# Altium footprint library Sensor.PcbLib: 51 footprints (part 4 of 4)
Each footprint in its own frame and in the unit in brackets; x right, y up, seen from the top. Pads: shape width x height; smd on the part's side, far side on the other; paste and mask are expansions set on the pad; w line width, h text height; cw(c..) or ccw(c..) is an arc to the next point about the centre after c.
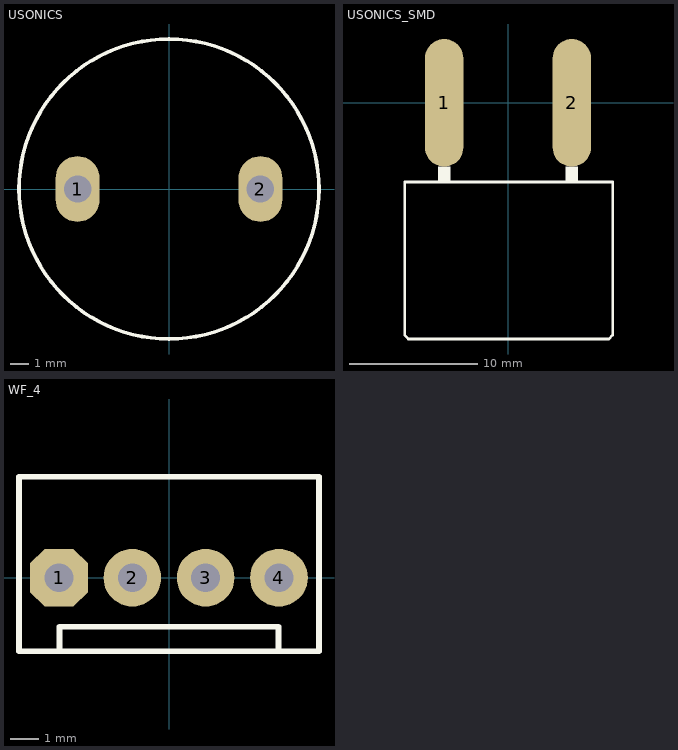
[diagram p3: the footprints below, top view; thin cyan lines are the x and y axes]

## USONICS [mm] "ULTRASONIC 400PT160"
height 1.27
pads (2):
  oval 2.4x3.6 hole 1.5: 1(-5,0) 2(5,0)
Top Overlay:
  circle w0.2: c0,0 r8.2
3D body "User Library-400PT160.STEP": height 12.1, standoff -9.9, extent -8.1,-8.1 8.1,8.1

## USONICS_SMD [mm] "ULTRASONIC 400PT160"
height 1.27
pads (2):
  oval 3x10 smd: 1(-5,0) 2(5,0)
Top Overlay:
  rectangle: 4.5,-6.2 5.5,-5
  rectangle: -5.5,-6.2 -4.5,-5
  lines w0.2: -8.1,-18.2 -7.8,-18.5 7.9,-18.5 8.2,-18.2 8.2,-6.2 -8.1,-6.2 -8.1,-18.2
3D body "User Library-400PT160.STEP": height 8.6, standoff -7.6, extent -8.05,-18.4 8.15,3.6

## WF_4 [mm] "DS1070  WF, Cvilux CI31 pitch 2.54mm"
pads (4):
  oct 2x2 hole 1: 1(-3.81,0)
  round 2 hole 1: 2(-1.27,0) 3(1.27,0) 4(3.81,0)
Top Overlay:
  lines w0.2: -3.8,-2.548 -3.8,-1.7 3.8,-1.7 3.8,-2.548 ; -5.2,-2.548 5.2,-2.548 5.2,3.5 -5.2,3.5 -5.2,-2.548
3D body "User Library-CI31_4.step": height 11.56, standoff -3.24, extent -5.08,-2.402 5.08,3.398